# Altium footprint library Boards.PcbLib: 1 footprints
Each footprint in its own frame and in the unit in brackets; x right, y up, seen from the top. Pads: shape width x height; smd on the part's side, far side on the other; paste and mask are expansions set on the pad; w line width, h text height; cw(c..) or ccw(c..) is an arc to the next point about the centre after c.
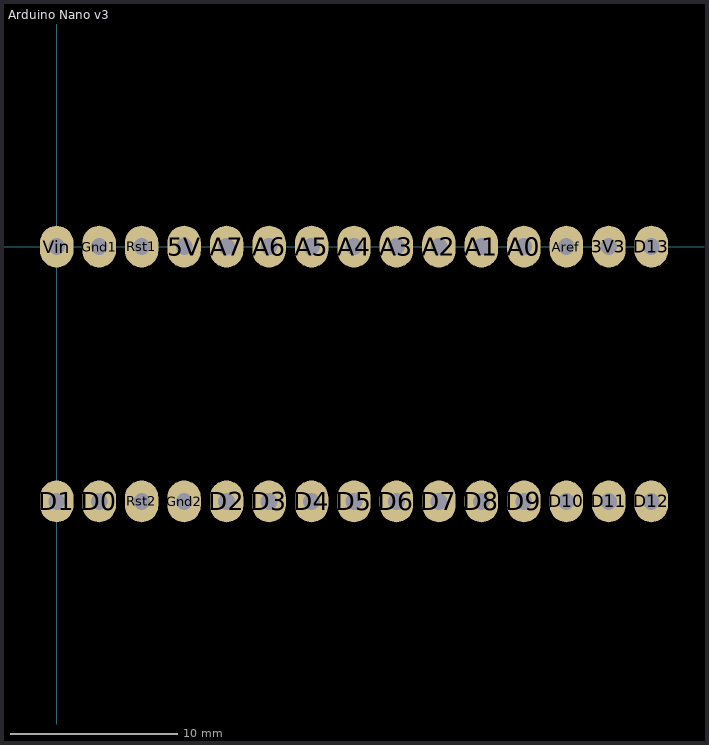
[diagram p0: the footprint, top view; thin cyan lines are the x and y axes]

## Arduino Nano v3 [mm]
pads (30):
  oval 2x2.5 hole 1: 3V3(33.02,0) 5V(7.62,0) A0(27.94,0) A1(25.4,0) A2(22.86,0) A3(20.32,0) A4(17.78,0) A5(15.24,0) A6(12.7,0) A7(10.16,0) Aref(30.48,0) D0(2.54,-15.24) D1(0,-15.24) D2(10.16,-15.24) D3(12.7,-15.24) D4(15.24,-15.24) D5(17.78,-15.24) D6(20.32,-15.24) D7(22.86,-15.24) D8(25.4,-15.24) D9(27.94,-15.24) D10(30.48,-15.24) D11(33.02,-15.24) D12(35.56,-15.24) D13(35.56,0) Gnd1(2.54,0) Gnd2(7.62,-15.24) Rst1(5.08,0) Rst2(5.08,-15.24) Vin(0,0)
3D body: height 12.73, standoff -5.83, extent -3.81,-16.515 41.11,1.275